# Altium footprint library Controller.PcbLib: 11 footprints
Each footprint in its own frame and in the unit in brackets; x right, y up, seen from the top. Pads: shape width x height; smd on the part's side, far side on the other; paste and mask are expansions set on the pad; w line width, h text height; cw(c..) or ccw(c..) is an arc to the next point about the centre after c.
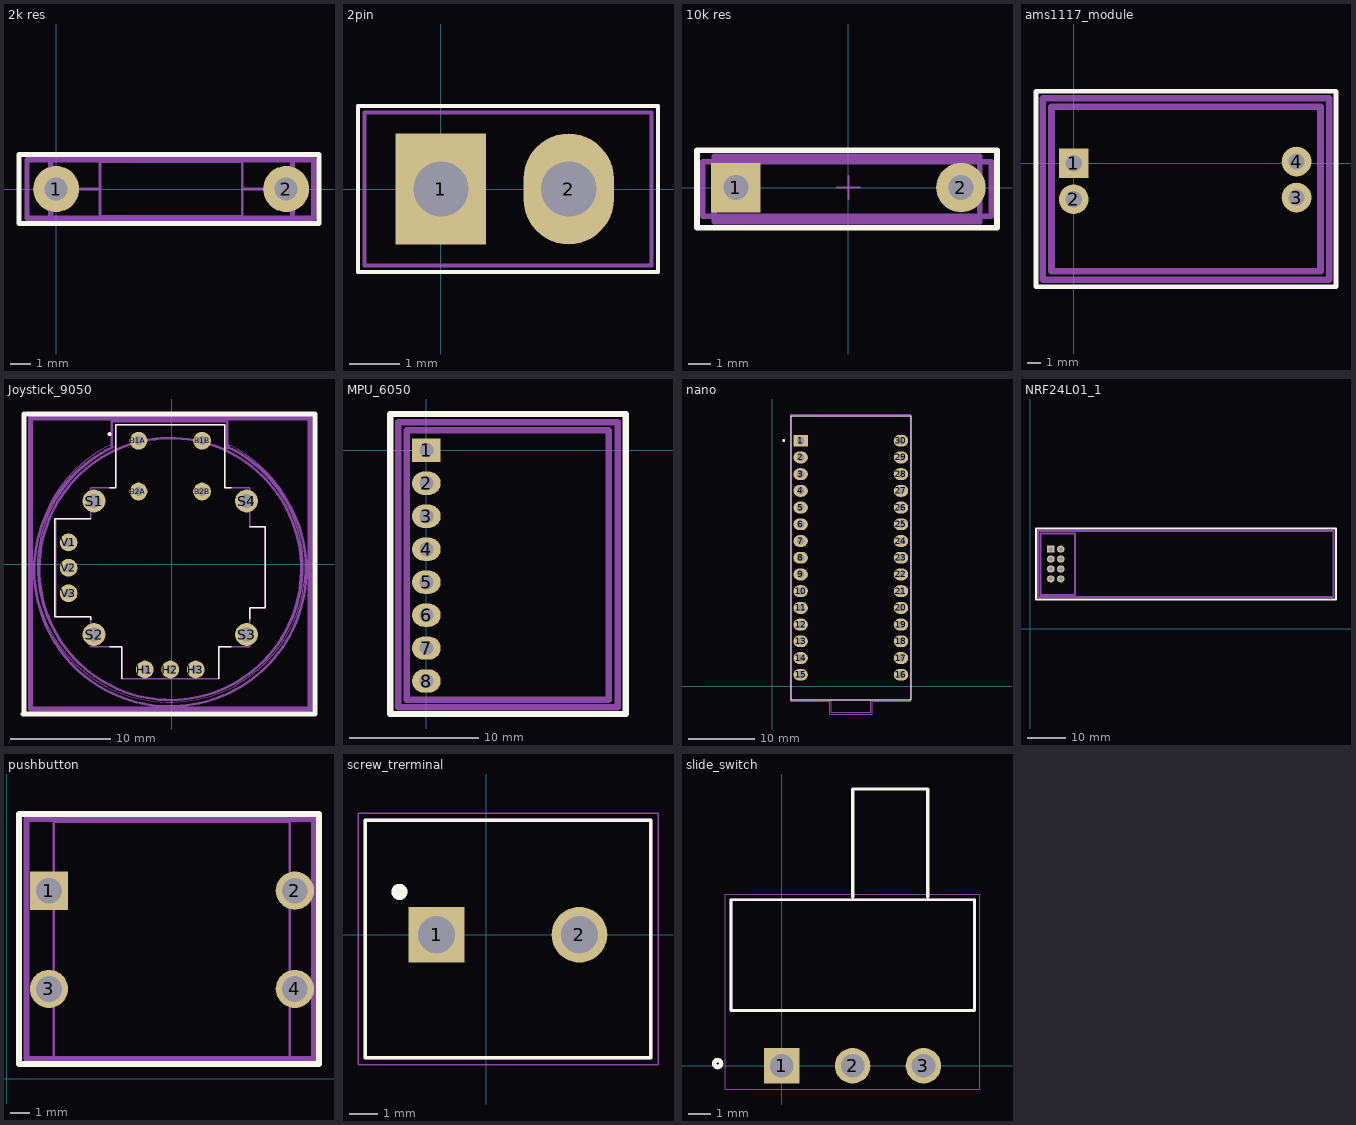
[diagram p0: the footprints below, top view; thin cyan lines are the x and y axes]

## 2k res [mm]
pads (2):
  round 2.2 hole 1.1: 1(0,0) 2(11,0)
Top Overlay:
  lines w0.25: -1.778,-1.651 -1.778,1.651 -1.524,1.651 12.573,1.651 12.573,-1.651 -1.778,-1.651
  text ".Designator" at -1.524,2.238 h1
Mechanical 15:
  lines w0.25: -1.397,-1.397 -1.397,1.397 -1.143,1.397 12.319,1.397 12.319,-1.397 -1.397,-1.397
Mechanical 13 (Mech13):
  lines w0.127: 0.6,0 2.1,0 ; 10.4,0 8.9,0 ; 2.1,0 2.1,-1.3 8.9,-1.3 8.9,0 ; 2.1,0 2.1,1.3 8.9,1.3 8.9,0
  lines w0.25: -0.254,-1.397 -0.254,1.397 11.303,1.397 11.303,-1.397 -0.254,-1.397
3D body "step_temp.STEP": height 2.6, standoff -25.53, extent -0.275,-1.3 11.275,1.3

## 2pin [mm]
pads (2):
  rect 1.8x2.2 hole 1.1: 1(0,0)
  oval 1.8x2.2 hole 1.1: 2(2.54,0)
Top Overlay:
  lines w0.08: -1.651,-1.651 4.318,-1.651 4.318,1.651 -1.651,1.651 -1.651,-1.651
  text ".Designator" at -1.497,1.98 h0.52
Mechanical 15:
  lines w0.08: -1.524,-1.524 -1.524,1.524 4.191,1.524 4.191,-1.524 -1.524,-1.524
Mechanical 13:
  lines w0.08: -1.651,-1.651 -1.651,-0.826 -1.651,0.826 -1.651,1.651 -1.524,1.651 4.318,1.651 4.318,-1.651 -1.651,-1.651
3D body "3-644456-2.stp": height 5.35, standoff -7.48, extent -1.143,-1.168 3.637,1.168

## 10k res [mm] "10k ohm resistor"
pads (2):
  rect 2.2x2.2 hole 1.1 paste-1000 mask+0: 1(-5,0)
  round 2.2 hole 1.1 paste-1000 mask+0: 2(5,0)
Top Overlay:
  lines w0.25: -6.731,-1.778 6.604,-1.778 6.604,1.651 -6.731,1.651 -6.731,-1.778
  text ".Designator" at -6.35,2.238 h1
Mechanical 15:
  lines w0.25: -6.477,-1.27 6.35,-1.27 6.35,1.143 -6.096,1.143 -6.477,1.143 -6.477,-1.27
Mechanical 13:
  lines w0.25: -5.969,-1.524 5.842,-1.524 5.842,1.397 -5.715,1.397 -5.969,1.397 -5.969,-1.524
Top Component Center:
  lines w0.1: -0.5,0 0.5,0 ; 0,-0.5 0,0.5
3D body "Res_Vishay_MRS25000C1910FCT00_eec.STEP": height 0.25, standoff 0, extent -5.725,-1.35 5.725,1.35

## ams1117_module [mm]
pads (4):
  rect 2.2x2.2 hole 1.2: 1(0,0)
  round 2.2 hole 1.2: 2(0,-2.667) 3(16.51,-2.54) 4(16.51,0.127)
Top Overlay:
  lines w0.35: -2.794,-9.144 19.431,-9.144 19.431,5.334 -2.794,5.334 -2.794,-9.144
  text ".Designator" at -2.794,6.223 h1.52
Mechanical 15:
  lines w0.5: -1.651,-8.001 18.288,-8.001 18.288,4.191 -1.651,4.191 -1.651,-8.001
Mechanical 13:
  lines w0.5: -2.286,-8.636 -2.286,4.826 -1.651,4.826 18.923,4.826 18.923,-8.636 -2.286,-8.636
3D body "Volt Reg 2.step": height 2.85, standoff -5.44, extent -1.651,-8.032 18.349,3.968

## Joystick_9050 [mil] "Joystick encoder"
pads (14):
  round 70 hole 35.43: B1A(-130,485) B1B(120,485) B2A(-130,285) B2B(120,285)
  round 70 hole 35: H1(-105,-415) H2(-5,-415) H3(95,-415) V1(-405,85) V2(-405,-15) V3(-405,-115)
  round 90 hole 55: S1(-305,247.5) S2(-305,-277.5) S3(295,-277.5) S4(295,247.5)
Top Overlay:
  circle w7.87: c-243.19,510.59 r3.94
  lines w5: -317.99,-218.54 -317.99,-207.91 -460,-207.91 -460,177.91 -317.99,177.91 ; -243.98,-326.02 -195.94,-326.02 -195.94,-452.01 ; -243.98,299.96 -219.57,299.96 -219.57,547.99 209.57,547.99 209.57,299.96 234.37,299.96 ; 185.94,-452.01 185.94,-326.02 234.37,-326.02 ; 307.99,-216.57 307.99,-172.48 369.02,-172.48 369.02,146.42 307.99,146.42
  lines w9.84: 565,-590 565,0
  lines w19.68: -585,-590 565,-590 565,590 -570,590 ; -580,-590 -580,-295 -580,295 -580,590
Mechanical 15:
  lines w10: -235,459.51 -235,565 220,565 220,460.5 cw(c-5,-25) -234.47,458.39
  lines w19.68: 219.99,460.5 220,460.5
Mechanical 13:
  lines w19.68: -555,-570 545,-570 545,575 -555,575 -555,-470 -555,-570
Mechanical 13 (Mech13):
  circle w7.87: c-243.19,510.59 r3.94
  lines w5: -217.33,464.35 ccw(c-5,-12.55) 207.33,464.35 ; -455,-207.91 -317.99,-207.91 -317.99,-326.02 -195.94,-326.02 -195.94,-452.01 185.94,-452.01 185.94,-326.02 307.99,-326.02 307.99,-172.48 369.02,-172.48 369.02,146.42 307.99,146.42 307.99,299.96 209.57,299.96 209.57,547.99 -219.57,547.99 -219.57,299.96 -317.99,299.96 -317.99,177.91 -455,177.91 -455,-207.91
  lines w10: -15,495 ccw(c-5,-20) -8.71,495.08
Mechanical 15 (Mech15):
  lines w1.97: -233.35,471.22 -233.35,559.8 219.41,559.8 219.41,471.22 ; -232.17,471.77 ccw(c-6.97,-11.17) 218.23,471.77
3D body "COM-09032--3DModel-STEP-56544.STEP": height 1190.5, standoff -174.35, extent -525,-540 525,546.83

## MPU_6050 [mm]
pads (8):
  rect 2.2x1.8 hole 1.1: 1(0,0)
  oval 2.2x1.8 hole 1.1: 2(0,-2.54) 3(0,-5.08) 4(0,-7.62) 5(0,-10.16) 6(0,-12.7) 7(0,-15.24) 8(0,-17.78)
Top Overlay:
  lines w0.5: -2.794,-20.32 -2.794,2.794 -2.667,2.794 15.367,2.794 15.367,-20.32 -2.794,-20.32
  text ".Designator" at -2.54,3.556 h1.52
Mechanical 15:
  lines w0.5: -1.524,-19.233 -1.524,1.524 1.744,1.524 9.524,1.524 14.036,1.524 14.036,-4.036 14.036,-14.168 14.036,-19.233 10.146,-19.233 2.366,-19.233 -1.524,-19.233
Mechanical 13:
  lines w0.5: -2.159,2.159 -2.159,-19.812 14.732,-19.812 14.732,2.159 -2.032,2.159
3D body "User Library-GY-521-1.STEP": height 7.77, standoff -4.05, extent -1.27,-19.177 13.975,1.143

## nano [mm]
pads (30):
  rect 2.2x1.8 hole 1.1: 1(4.318,37.338)
  oval 2.2x1.8 hole 1.1: 2(4.318,34.798) 3(4.318,32.258) 4(4.318,29.718) 5(4.318,27.178) 6(4.318,24.638) 7(4.318,22.098) 8(4.318,19.558) 9(4.318,17.018) 10(4.318,14.478) 11(4.318,11.938) 12(4.318,9.398) 13(4.318,6.858) 14(4.318,4.318) 15(4.318,1.778) 16(19.558,1.778) 17(19.558,4.318) 18(19.558,6.858) 19(19.558,9.398) 20(19.558,11.938) 21(19.558,14.478) 22(19.558,17.018) 23(19.558,19.558) 24(19.558,22.098) 25(19.558,24.638) 26(19.558,27.178) 27(19.558,29.718) 28(19.558,32.258) 29(19.558,34.798) 30(19.558,37.338)
Top Overlay:
  circle w0.2: c1.738,37.358 r0.1
  lines w0.127: 2.794,-2.032 2.794,41.148 21.082,41.148 21.082,-2.032 2.794,-2.032
Mechanical 13 (Mech13):
  circle w0.2: c1.738,37.358 r0.1
  lines w0.127: 8.968,-2.032 8.968,-3.937 14.938,-3.937 14.938,-2.032 ; 8.968,-2.032 2.794,-2.032 2.794,41.148 21.082,41.148 21.082,-2.032 14.938,-2.032 ; 8.968,-2.032 14.938,-2.032
Mechanical 15 (Mech15):
  lines w0.05: 2.798,-2.282 8.718,-2.282 8.718,-4.187 15.188,-4.187 15.188,-2.282 21.078,-2.282 21.078,41.398 2.798,41.398 2.798,-2.282
3D body "step_temp.STEP": height 12.6, standoff -6, extent 2.938,-2.042 20.938,42.958

## NRF24L01_1 [mm]
pads (8):
  oval 2x1.8 hole 1.1: 1(5.334,12.827) 2(7.874,12.827) 3(5.334,15.367) 4(7.874,15.367) 5(5.334,17.907) 6(7.874,17.907) 8(7.874,20.447)
  rect 2x1.8 hole 1.1: 7(5.334,20.447)
Top Overlay:
  lines w0.5: 1.524,7.493 78.613,7.493 78.613,25.781 1.524,25.781 1.524,7.493
  text ".Designator" at 1.778,26.543 h1.52
Mechanical 15:
  lines w0.5: 4.699,20.447 5.334,20.447 ; 2.667,8.636 11.557,8.636 11.557,12.605 11.557,20.542 11.557,24.511 2.667,24.511 2.667,8.636
Mechanical 13:
  lines w0.5: 2.032,8.128 77.978,8.128 77.978,25.146 2.032,25.146 2.032,8.128
3D body "NRF24l01_with_antenna.STEP": height 3.24, standoff -95.45, extent 3.175,9.012 77.14,24.262

## pushbutton [mm]
pads (4):
  rect 1.95x1.95 hole 1.3: 1(2.159,9.572)
  round 1.95 hole 1.3: 2(14.659,9.572) 3(2.159,4.572) 4(14.659,4.572)
Top Overlay:
  lines w0.3: 0.635,0.762 15.875,0.762 15.875,13.462 0.635,13.462 0.635,0.762
  text ".Designator" at 0.762,13.758 h0.51
Mechanical 13:
  lines w0.3: 1.016,1.016 1.016,13.208 15.621,13.208 15.621,1.016 1.016,1.016
Mechanical 13 (Mech13):
  lines w0.127: 2.409,6.072 2.409,8.072 ; 14.409,6.072 14.409,8.072 ; 2.413,1.072 2.413,13.072 14.409,13.072 14.409,1.072 2.413,1.072
Mechanical 15 (Mech15):
  lines w0.05: 0.934,0.822 15.884,0.822 15.884,13.322 0.934,13.322 0.934,0.822
3D body "switch1.SLDPRT": height 10.21, standoff -3.64, extent 1.894,0.615 14.882,13.609

## screw_trerminal [mm]
pads (2):
  rect 1.95x1.95 hole 1.3: 1(-1.738,0)
  round 1.95 hole 1.3: 2(3.262,0)
Top Overlay:
  circle w0.28: c-3.038,1.5 r0.14
  lines w0.127: -4.238,-4.3 -4.238,4 5.762,4 5.762,-4.3 -4.238,-4.3
Mechanical 15:
  text ".Designator" at -3.937,4.604 h1.24
Mechanical 13 (Mech13):
  circle w0.28: c-3.038,1.5 r0.14
  lines w0.127: -4.238,-4.3 5.762,-4.3 5.762,4 -4.238,4 -4.238,-4.3
Mechanical 15 (Mech15):
  lines w0.05: -4.488,-4.55 -4.488,4.25 6.012,4.25 6.012,-4.55 -4.488,-4.55
3D body "1935161--3DModel-STEP-56544.STEP": height 11.41, standoff -3.49, extent -4.278,-5.087 6.122,3.913

## slide_switch [mm]
pads (3):
  rect 1.605x1.605 hole 1.07: 1(0,0)
  round 1.605 hole 1.07: 2(3.2,0) 3(6.4,0)
Top Overlay:
  circle w0.2: c-2.9,0.1 r0.158
  lines w0.127: 4.28,2.5 5.33,2.5 ; -2.3,2.5 -2.3,7.5 8.7,7.5 8.7,2.5 -2.3,2.5
  lines w0.152: 3.2,7.62 3.2,12.5 6.6,12.5 6.6,7.62
Mechanical 13 (Mech13):
  lines w0.127: -2.3,2.5 -2.3,7.5 8.7,7.5 8.7,2.5 -2.3,2.5
Mechanical 15 (Mech15):
  lines w0.05: -2.55,-1.05 -2.55,7.75 8.95,7.75 8.95,-1.05 -2.55,-1.05
3D body "1825116-1.stp": height 5.61, standoff -4.15, extent -2.325,-0.134 8.675,12.366